# Altium footprint library Arduino Nano Every PCBLib.PcbLib: 81 footprints (part 2 of 6)
Each footprint in its own frame and in the unit in brackets; x right, y up, seen from the top. Pads: shape width x height; smd on the part's side, far side on the other; paste and mask are expansions set on the pad; w line width, h text height; cw(c..) or ccw(c..) is an arc to the next point about the centre after c.
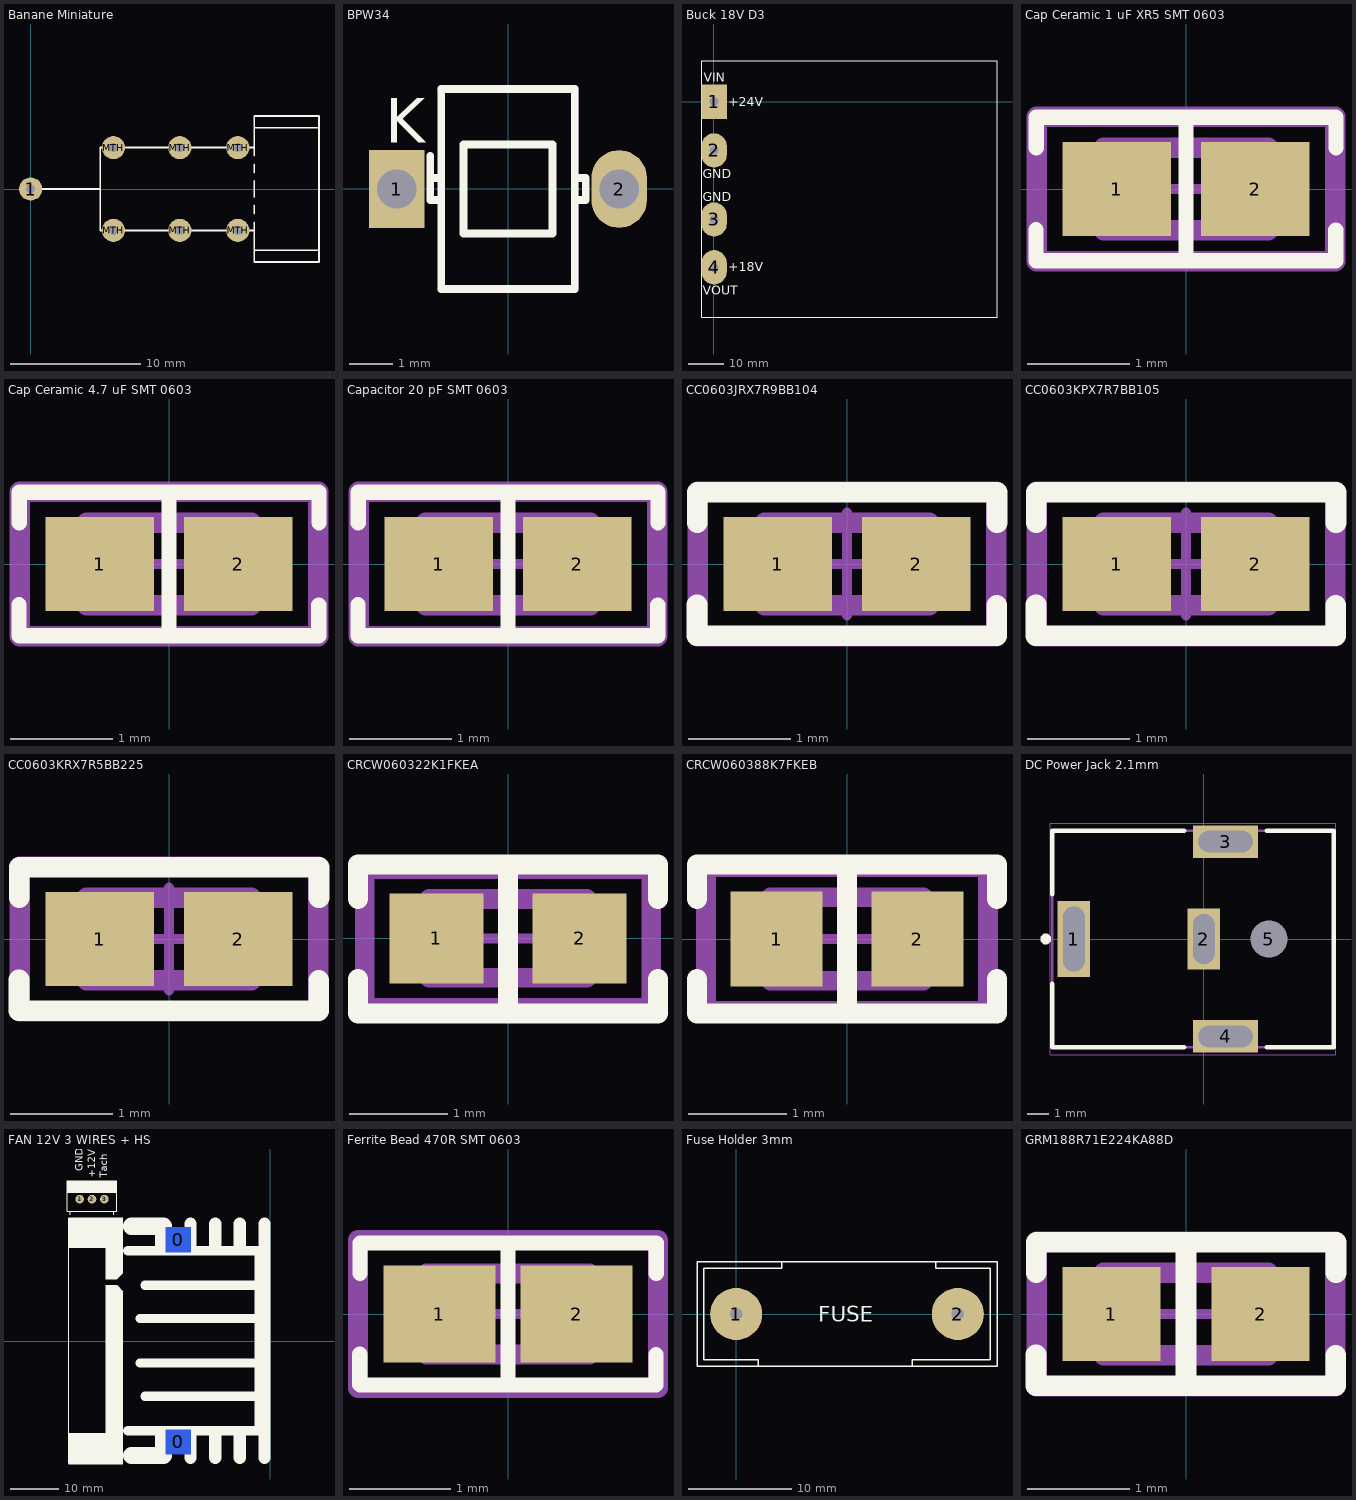
[diagram p1: the footprints below, top view; thin cyan lines are the x and y axes]

## Banane Miniature [mil] "Banane Miniature"
pads (7):
  round 70 hole 27.6: 1(0.02,1.07) MTH(250.02,-123.93) MTH(250.02,126.07) MTH(450.02,-123.93) MTH(450.02,126.07) MTH(625.02,-123.93) MTH(625.02,126.07)
Top Overlay:
  lines w5: 0.02,1.07 210.02,1.07 ; 675.02,-183.93 870.02,-183.93 ; 675.02,-98.93 675.02,-123.93 ; 675.02,-73.93 675.02,-48.93 ; 675.02,-23.93 675.02,26.07 ; 675.02,51.07 675.02,76.07 ; 675.02,101.07 675.02,126.07 ; 675.02,186.07 870.02,186.07 ; 675.02,-123.93 675.02,-218.93 870.02,-218.93 870.02,221.07 675.02,221.07 675.02,126.07 ; 675.02,-123.93 210.02,-123.93 210.02,126.07 675.02,126.07
3D body "User Library-Bananajack red.STEP": height 349.09, standoff -89.09, extent -69.98,-218.03 868.21,220.16

## BPW34 [mil] "BPW34 Trough Hole"
pads (2):
  rect 50x70 hole 35.4: 1(-100,-0.21)
  oval 50x70 hole 35.4: 2(100,-0.21)
Top Overlay:
  lines w7: -70,9.79 -60,9.79 ; -70,29.79 -70,-10.21 -60,-10.21 ; 60,-10.21 70,-10.21 70,9.79 60,9.79 ; -60,-90.21 60,-90.21 60,89.79 -60,89.79 -60,-90.21 ; -40,-40.21 40,-40.21 40,39.79 -40,39.79 -40,-0.21 -40,-40.21
  text "K" at -110.36,41.38 h40
Top Assembly:
  lines w7: -60,-90.21 60,-90.21 60,89.79 -60,89.79
3D body: height 77, standoff 75, extent -40,-40.21 40,39.79
3D body: height 70, standoff 10, extent -60,-90.21 60,89.79

## Buck 18V D3 [mil] "Buck 18V D3"
pads (4):
  rect 280x380 hole 100: 1(1.66,0.26)
  oval 280x380 hole 100: 2(1.66,-539.74) 3(1.66,-1304.74) 4(1.66,-1834.74)
Top Overlay:
  lines w5: -138.34,-2389.74 3136.66,-2389.74 3136.66,455.26 -138.34,455.26 -138.34,-2389.74
  text "VIN" at -113.34,220.26 h100
  text "+24V" at 156.66,-49.74 h100
  text "+18V" at 156.66,-1879.74 h100
  text "VOUT" at -123.34,-2139.74 h100
  text "GND" at -123.34,-1104.74 h100
  text "GND" at -123.34,-849.74 h100
3D body: height 410, standoff 360, extent 1186.65,-414.74 1361.66,-364.74
3D body: height 360, standoff 190, extent 1186.66,-414.74 1236.66,-364.74
3D body: height 62, standoff 0, extent -98.34,-1934.74 101.66,-1734.74
3D body: height 220, standoff -180, extent -40.34,-1876.73 43.66,-1792.73
3D body: height 62, standoff 0, extent -98.34,-1934.74 101.66,-1734.74
3D body: height 125, standoff 63, extent -98.34,-1934.74 101.66,-1734.74
3D body: height 260, standoff 190, extent -88.24,-1924.71 91.66,-1744.76
3D body: height 265, standoff 258, extent -43.34,-1879.74 46.66,-1789.74
3D body: height 62, standoff 0, extent -98.34,-1404.74 101.66,-1204.74
3D body: height 220, standoff -180, extent -40.34,-1346.74 43.66,-1262.74
3D body: height 62, standoff 0, extent -98.34,-1404.74 101.66,-1204.74
3D body: height 125, standoff 63, extent -98.34,-1404.74 101.66,-1204.74
3D body: height 260, standoff 190, extent -88.24,-1394.71 91.66,-1214.76
3D body: height 265, standoff 258, extent -43.34,-1349.74 46.66,-1259.74
3D body: height 62, standoff 0, extent -99.16,-640.39 100.84,-440.39
3D body: height 220, standoff -180, extent -41.15,-582.38 42.85,-498.38
3D body: height 62, standoff 0, extent -99.16,-640.39 100.84,-440.39
3D body: height 125, standoff 63, extent -99.16,-640.39 100.84,-440.39
3D body: height 260, standoff 190, extent -89.05,-630.36 90.85,-450.41
3D body: height 265, standoff 258, extent -44.15,-585.39 45.85,-495.39
3D body: height 269, standoff 190, extent 351.66,-329.73 451.66,-319.73
3D body: height 269, standoff 190, extent 351.66,-319.73 451.66,-219.73
3D body: height 269, standoff 190, extent 456.66,-329.73 556.66,-319.73
3D body: height 269, standoff 190, extent 456.66,-319.73 556.66,-219.73
3D body: height 269, standoff 190, extent 561.66,-329.73 661.66,-319.73
3D body: height 269, standoff 190, extent 561.66,-319.73 661.66,-219.73
3D body: height 269, standoff 190, extent 666.66,-329.73 766.66,-319.73
3D body: height 269, standoff 190, extent 666.66,-319.73 766.66,-219.73
3D body: height 269, standoff 190, extent 771.66,-329.73 871.66,-319.73
3D body: height 269, standoff 190, extent 771.66,-319.73 871.66,-219.73
3D body: height 269, standoff 190, extent 876.66,-329.73 976.66,-319.73
3D body: height 269, standoff 190, extent 876.66,-319.73 976.66,-219.73
3D body: height 269, standoff 190, extent 981.66,-329.73 1081.66,-319.73
3D body: height 269, standoff 190, extent 981.66,-319.73 1081.66,-219.73
3D body: height 360, standoff 190, extent 911.66,-699.74 961.66,-649.74
3D body: height 360, standoff 190, extent 911.66,-574.74 961.66,-524.74
3D body: height 360, standoff 190, extent 911.66,-449.74 961.66,-399.74
3D body: height 360, standoff 190, extent 911.66,-139.74 961.66,-89.74
3D body: height 360, standoff 190, extent 911.66,-14.74 961.66,35.26
3D body: height 410, standoff 360, extent 211.66,-574.74 961.66,-524.74
3D body: height 191, standoff 190, extent -128.34,-854.74 -53.34,-744.74
3D body: height 191, standoff 190, extent 71.66,-854.74 146.66,-744.74
3D body: height 191, standoff 190, extent -28.34,-854.74 46.66,-744.74
3D body: height 191, standoff 190, extent 171.66,-2144.74 246.66,-2034.74
3D body: height 191, standoff 190, extent 71.66,-2144.74 146.66,-2034.74
3D body: height 191, standoff 190, extent -28.34,-2144.74 46.66,-2034.74
3D body: height 191, standoff 190, extent -128.34,-2144.74 -48.34,-2034.74
3D body: height 191, standoff 190, extent 66.66,215.26 141.66,325.26
3D body: height 191, standoff 190, extent -18.34,215.26 26.66,325.26
3D body: height 191, standoff 190, extent -118.34,215.26 -38.34,325.26
3D body: height 186, standoff 185, extent 2346.66,-729.74 3061.66,-329.74
3D body: height 186, standoff 185, extent 2346.66,-2164.74 3061.66,-809.74
3D body: height 186, standoff 185, extent -138.34,-2069.74 1541.66,-1599.74
3D body: height 186, standoff 185, extent -138.34,-1539.74 1541.66,-1069.74
3D body: height 186, standoff 185, extent -138.34,-774.74 1541.66,-304.74
3D body: height 186, standoff 185, extent -138.34,-234.74 1541.66,235.26
3D body: height 269, standoff 190, extent 1086.66,-319.74 1186.66,-219.74
3D body: height 269, standoff 190, extent 1086.66,-329.74 1186.66,-319.74
3D body: height 265, standoff 258, extent -43.34,-44.74 46.66,45.26
3D body: height 260, standoff 190, extent -88.23,-89.71 91.67,90.24
3D body: height 185, standoff 130, extent -138.34,-2389.74 3136.66,455.26
3D body: height 505, standoff 190, extent 2471.66,-1009.74 2941.66,-539.74
3D body: height 509, standoff 504, extent 2518.87,-962.68 2894.66,-586.79
3D body: height 311, standoff 309, extent 1366.66,-1664.74 1541.66,-1634.74
3D body: height 310, standoff 190, extent 1366.66,-1719.74 1541.66,-1429.74
3D body: height 311, standoff 309, extent 1186.66,-1664.74 1361.66,-1634.74
3D body: height 310, standoff 190, extent 1186.66,-1719.74 1361.66,-1429.74
3D body: height 215, standoff 190, extent 1711.66,-1039.74 1911.66,-839.74
3D body: height 290, standoff 190, extent 1656.66,-279.74 1956.66,20.26
3D body: height 290, standoff 190, extent 1846.66,-654.74 2146.66,-354.74
3D body: height 475, standoff 295, extent 1361.66,-464.74 1761.66,-64.74
3D body: height 350, standoff 295, extent 1761.66,-464.74 2061.66,-64.74
3D body: height 525, standoff 520, extent 561.66,-189.74 686.66,225.26
3D body: height 525, standoff 520, extent 561.66,-764.74 686.66,-344.74
3D body: height 315, standoff 175, extent 261.66,-139.74 436.66,160.26
3D body: height 410, standoff 360, extent 211.66,-14.74 961.66,35.26
3D body: height 410, standoff 360, extent 211.66,110.26 961.66,160.26
3D body: height 410, standoff 360, extent 211.66,-139.74 961.66,-89.74
3D body: height 360, standoff 190, extent 911.66,110.26 961.66,160.26
3D body: height 245, standoff 190, extent 436.66,-139.74 561.66,160.26
3D body: height 245, standoff 190, extent 436.66,-699.74 561.66,-399.74
3D body: height 315, standoff 190, extent 261.66,-699.74 436.66,-399.74
3D body: height 410, standoff 360, extent 211.66,-699.74 961.66,-649.74
3D body: height 410, standoff 360, extent 211.66,-449.74 961.66,-399.74
3D body: height 360, standoff 190, extent 1186.66,-164.74 1236.66,-114.74
3D body: height 410, standoff 360, extent 1186.65,-164.74 1361.66,-114.74
3D body: height 130, standoff 30, extent 2761.66,85.26 3111.66,435.26
3D body: height 130, standoff 30, extent 2761.66,-2364.74 3111.66,-2014.74
3D body: height 125, standoff 63, extent -98.34,-99.74 101.66,100.26
3D body: height 62, standoff 0, extent -98.34,-99.74 101.66,100.26
3D body: height 222, standoff -178, extent -40.34,-41.73 43.66,42.27
3D body: height 62, standoff 0, extent -98.34,-99.74 101.66,100.26
3D body: height 135, standoff 65, extent -48.24,-639.71 131.66,-459.76
3D body: height 140, standoff 133, extent -3.34,-594.74 86.66,-504.74
3D body: height 220, standoff -180, extent -40.34,-1346.74 43.66,-1262.74
3D body: height 62, standoff 0, extent -98.34,-1404.74 101.66,-1204.74
3D body: height 135, standoff 65, extent -88.24,-1394.71 91.66,-1214.76
3D body: height 140, standoff 133, extent -43.34,-1349.74 46.66,-1259.74
3D body: height 135, standoff 65, extent -48.24,-1934.71 131.66,-1754.76
3D body: height 140, standoff 133, extent -3.34,-1889.74 86.66,-1799.74
3D body: height 200, standoff 190, extent 1626.65,-229.74 1656.66,-29.74
3D body: height 200, standoff 190, extent 2146.65,-604.74 2176.66,-404.74
3D body: height 200, standoff 190, extent 1956.66,-39.74 1996.66,-9.74
3D body: height 200, standoff 190, extent 1956.66,-249.74 1996.66,-219.74
3D body: height 200, standoff 190, extent 1806.66,-624.74 1846.66,-594.74
3D body: height 200, standoff 190, extent 1806.66,-414.74 1846.66,-384.74
3D body: height 352, standoff 350, extent 1866.75,-344.71 2016.66,-194.76
3D body "RESISTOR 0.25W 0.4.STEP": height 405.5, standoff 190, extent 1261.15,-1778.74 1352.16,-1354.74
3D body "Led 3mm vert.STEP": height 340.51, standoff 214, extent 1007.59,-1429.59 1301.66,-1299.74
3D body: height 191, standoff 190, extent 1560.41,-812.24 1642.91,-737.24
3D body: height 191, standoff 190, extent 1560.41,-937.24 1642.91,-862.24
3D body: height 191, standoff 190, extent 2010.41,-1237.24 2092.91,-1162.24
3D body: height 191, standoff 190, extent 2110.41,-1237.24 2192.91,-1162.24
3D body: height 191, standoff 190, extent 2235.41,-1187.24 2317.91,-1112.24
3D body: height 191, standoff 190, extent 2235.41,-1287.24 2317.91,-1212.24
3D body: height 191, standoff 190, extent 2235.41,-1062.24 2317.91,-987.24
3D body: height 191, standoff 190, extent 2235.41,-1412.24 2317.91,-1337.24
3D body: height 191, standoff 190, extent 1955.41,-62.24 2037.91,12.76
3D body: height 191, standoff 190, extent 1955.41,-272.24 2037.91,-197.24
3D body: height 191, standoff 190, extent 1765.42,-437.24 1847.91,-362.24
3D body: height 191, standoff 190, extent 1765.42,-647.24 1847.91,-572.24
3D body: height 200, standoff 190, extent 1716.66,-1064.74 1726.66,-1034.73
3D body: height 200, standoff 190, extent 1736.66,-1064.74 1746.66,-1034.73
3D body: height 200, standoff 190, extent 1756.66,-1064.74 1766.66,-1034.73
3D body: height 200, standoff 190, extent 1776.66,-1064.74 1786.66,-1034.73
3D body: height 200, standoff 190, extent 1796.66,-1064.74 1806.66,-1034.73
3D body: height 200, standoff 190, extent 1816.66,-1064.74 1826.66,-1034.73
3D body: height 200, standoff 190, extent 1836.66,-1064.74 1846.66,-1034.73
3D body: height 200, standoff 190, extent 1856.66,-1064.74 1866.66,-1034.73
3D body: height 200, standoff 190, extent 1876.66,-1064.74 1886.66,-1034.73
3D body: height 200, standoff 190, extent 1896.66,-1064.74 1906.66,-1034.73
3D body: height 200, standoff 190, extent 1896.66,-844.74 1906.66,-814.73
3D body: height 200, standoff 190, extent 1876.66,-844.74 1886.66,-814.73
3D body: height 200, standoff 190, extent 1856.66,-844.74 1866.66,-814.73
3D body: height 200, standoff 190, extent 1836.66,-844.74 1846.66,-814.73
3D body: height 200, standoff 190, extent 1816.66,-844.74 1826.66,-814.73
3D body: height 200, standoff 190, extent 1796.66,-844.74 1806.66,-814.73
3D body: height 200, standoff 190, extent 1776.66,-844.74 1786.66,-814.73
3D body: height 200, standoff 190, extent 1756.66,-844.74 1766.66,-814.73
3D body: height 200, standoff 190, extent 1736.66,-844.74 1746.66,-814.73
3D body: height 200, standoff 190, extent 1716.66,-844.74 1726.66,-814.73
3D body: height 225, standoff 190, extent 1761.66,-769.73 1811.66,-719.74
3D body: height 225, standoff 190, extent 1811.66,-769.73 1821.66,-719.74
3D body: height 225, standoff 190, extent 1751.66,-769.73 1761.66,-719.74
3D body: height 225, standoff 190, extent 1926.65,-804.74 1976.65,-754.73
3D body: height 225, standoff 190, extent 1926.65,-754.73 1976.65,-744.73
3D body: height 225, standoff 190, extent 1926.65,-814.74 1976.65,-804.74
3D body: height 225, standoff 190, extent 1701.65,-1184.74 1751.65,-1134.73
3D body: height 225, standoff 190, extent 1701.65,-1134.73 1751.65,-1124.73
3D body: height 225, standoff 190, extent 1701.65,-1194.74 1751.65,-1184.74
3D body: height 225, standoff 190, extent 1931.65,-1159.74 1981.65,-1109.75
3D body: height 225, standoff 190, extent 1921.65,-1159.74 1931.65,-1109.75
3D body: height 225, standoff 190, extent 1981.65,-1159.74 1991.65,-1109.75
3D body: height 225, standoff 190, extent 1931.65,-1294.74 1981.65,-1244.75
3D body: height 225, standoff 190, extent 1921.65,-1294.74 1931.65,-1244.75
3D body: height 225, standoff 190, extent 1981.65,-1294.74 1991.65,-1244.75
3D body: height 225, standoff 190, extent 1931.65,-1359.74 1981.65,-1309.75
3D body: height 225, standoff 190, extent 1921.65,-1359.74 1931.65,-1309.75
3D body: height 225, standoff 190, extent 1981.65,-1359.74 1991.65,-1309.75
3D body: height 225, standoff 190, extent 1576.65,-1019.74 1626.65,-969.75
3D body: height 225, standoff 190, extent 1566.65,-1019.74 1576.65,-969.75
3D body: height 225, standoff 190, extent 1626.65,-1019.74 1636.65,-969.75
3D body: height 225, standoff 190, extent 1576.65,-1109.74 1626.65,-1059.75
3D body: height 225, standoff 190, extent 1566.65,-1109.74 1576.65,-1059.75
3D body: height 225, standoff 190, extent 1626.65,-1109.74 1636.65,-1059.75
3D body: height 200, standoff 190, extent 2611.65,-539.74 2811.65,-509.74
3D body: height 200, standoff 190, extent 2601.65,-1039.74 2801.65,-1009.74
3D body: height 200, standoff 190, extent 1366.65,-1749.74 1541.66,-1719.74
3D body: height 200, standoff 190, extent 1186.65,-1749.74 1361.66,-1719.74
3D body: height 200, standoff 190, extent 1366.65,-1429.74 1541.66,-1399.74
3D body: height 200, standoff 190, extent 1186.65,-1429.74 1361.66,-1399.74
3D body: height 192, standoff 190, extent 1256.72,-1828.72 1356.66,-1728.75
3D body: height 192, standoff 190, extent 1256.71,-1404.72 1356.66,-1304.75
3D body: height 192, standoff 190, extent 836.77,-524.71 1036.66,-324.76
3D body: height 192, standoff 190, extent 836.77,-649.71 1036.66,-449.76
3D body: height 192, standoff 190, extent 836.77,-774.71 1036.66,-574.77
3D body: height 192, standoff 190, extent 1111.77,-489.71 1311.66,-289.76
3D body: height 192, standoff 190, extent 1111.77,-239.7 1311.66,-39.76
3D body: height 192, standoff 190, extent 836.77,-214.71 1036.66,-14.77
3D body: height 192, standoff 190, extent 836.77,-89.71 1036.66,110.24
3D body: height 192, standoff 190, extent 836.77,35.29 1036.66,235.24
3D body: height 520, standoff 190, extent 561.66,-189.74 686.66,225.26
3D body: height 520, standoff 190, extent 561.66,-759.74 686.66,-344.74
3D body: height 269, standoff 190, extent 1086.66,-219.74 1186.66,-209.74
3D body: height 269, standoff 190, extent 981.66,-219.73 1081.66,-209.73
3D body: height 269, standoff 190, extent 876.66,-219.73 976.66,-209.73
3D body: height 269, standoff 190, extent 771.66,-219.73 871.66,-209.73
3D body: height 269, standoff 190, extent 666.66,-219.73 766.66,-209.73
3D body: height 269, standoff 190, extent 561.66,-219.73 661.66,-209.73
3D body: height 269, standoff 190, extent 456.66,-219.73 556.66,-209.73
3D body: height 269, standoff 190, extent 351.66,-219.73 451.66,-209.73
3D body: height 192, standoff 190, extent 346.66,-214.73 1191.66,-194.74
3D body: height 192, standoff 190, extent 346.66,-344.73 1191.66,-324.74
3D body: height 191, standoff 190, extent -28.34,-1109.74 46.66,-999.74
3D body: height 191, standoff 190, extent 71.66,-1109.74 146.66,-999.74
3D body: height 191, standoff 190, extent -128.34,-1109.74 -53.34,-999.74

## Cap Ceramic 1 uF XR5 SMT 0603 [mm] "1 µF ±10% 16V Ceramic Capacitor X5R 0603 (1608 Metric)"
pads (2):
  rect 1.058x0.912 smd paste+0 mask+0: 1(-0.677,0) 2(0.677,0)
Top Overlay:
  lines w0.15: -1.462,-0.696 -1.462,-0.396 ; -1.459,-0.699 1.459,-0.699 1.459,-0.399 ; -1.459,0.401 -1.459,0.701 1.462,0.701 1.462,0.401 ; 0,-0.699 0,0.699
Top Assembly:
  lines w0.2: -1.456,-0.706 -1.456,0.706 1.456,0.706 1.456,-0.706 -1.456,-0.706
Top Courtyard:
  lines w0.2: -1.456,-0.706 -1.456,0.706 1.456,0.706 1.456,-0.706 -1.456,-0.706
Board:
  lines w0.2: -0.8,-0.4 -0.8,0.4 0.8,0.4 0.8,-0.4 -0.8,-0.4
Top Component Center:
  lines w0.1: -0.5,0 0.5,0 ; 0,-0.5 0,0.5
3D body "Cap_YAGEO_CC0603KRX7R9BB271_eec.STEP": height 0.25, standoff 0, extent -1.456,-0.706 1.456,0.706

## Cap Ceramic 4.7 uF SMT 0603 [mm] "4.7 µF ±10% 16V Ceramic Capacitor X5R 0603 (1608 Metric)"
pads (2):
  rect 1.058x0.912 smd paste+0 mask+0: 1(-0.677,0) 2(0.677,0)
Top Overlay:
  lines w0.15: -1.462,-0.696 -1.462,-0.396 ; -1.459,-0.699 1.459,-0.699 1.459,-0.399 ; -1.459,0.401 -1.459,0.701 1.462,0.701 1.462,0.401 ; 0,-0.699 0,0.699
Top Assembly:
  lines w0.2: -1.456,-0.706 -1.456,0.706 1.456,0.706 1.456,-0.706 -1.456,-0.706
Top Courtyard:
  lines w0.2: -1.456,-0.706 -1.456,0.706 1.456,0.706 1.456,-0.706 -1.456,-0.706
Board:
  lines w0.2: -0.8,-0.4 -0.8,0.4 0.8,0.4 0.8,-0.4 -0.8,-0.4
Top Component Center:
  lines w0.1: -0.5,0 0.5,0 ; 0,-0.5 0,0.5
3D body "Cap_YAGEO_CC0603KRX7R9BB271_eec.STEP": height 0.25, standoff 0, extent -1.456,-0.706 1.456,0.706

## Capacitor 20 pF SMT 0603 [mm]
pads (2):
  rect 1.058x0.912 smd paste+0 mask+0: 1(-0.677,0) 2(0.677,0)
Top Overlay:
  lines w0.15: -1.462,-0.697 -1.462,-0.397 ; -1.459,-0.7 1.459,-0.7 1.459,-0.4 ; -1.459,0.4 -1.459,0.7 1.462,0.7 1.462,0.4 ; 0,-0.7 0,0.699
Top Assembly:
  lines w0.2: -1.456,-0.706 1.456,-0.706 1.456,0.706 -1.456,0.706 -1.456,-0.706
Top Courtyard:
  lines w0.2: -1.456,-0.706 1.456,-0.706 1.456,0.706 -1.456,0.706 -1.456,-0.706
Board:
  lines w0.2: -0.8,-0.4 0.8,-0.4 0.8,0.4 -0.8,0.4 -0.8,-0.4
Top Component Center:
  lines w0.1: -0.5,0 0.5,0 -0.5,0 ; 0,-0.5 0,0.5 0,-0.5
3D body "Cap_Yageo_CC0603JRNPO9BN200_eec.STEP": height 0.25, standoff 0, extent -1.456,-0.706 1.456,0.706

## CC0603JRX7R9BB104 [mm] "0.1 µF ±5% 50V Ceramic Capacitor X7R 0603 (1608 Metric)"
pads (2):
  rect 1.058x0.912 smd paste+0 mask+0: 1(-0.677,0) 2(0.677,0)
Top Overlay:
  lines w0.2: -1.462,-0.697 -1.462,-0.397 ; -1.459,-0.7 1.459,-0.7 1.459,-0.4 ; -1.459,0.4 -1.459,0.7 1.462,0.7 1.462,0.4
Top Assembly:
  lines w0.2: -1.456,-0.706 1.456,-0.706 1.456,0.706 -1.456,0.706 -1.456,-0.706
Top Courtyard:
  lines w0.2: -1.456,-0.706 1.456,-0.706 1.456,0.706 -1.456,0.706 -1.456,-0.706
Board:
  lines w0.2: -0.8,-0.4 0.8,-0.4 0.8,0.4 -0.8,0.4 -0.8,-0.4
Top Component Center:
  lines w0.1: -0.5,0 0.5,0 ; 0,-0.5 0,0.5
3D body "Cap_YAGEO_CC0603KRX7R9BB271_eec.STEP": height 0.25, standoff 0, extent -1.456,-0.706 1.456,0.706

## CC0603KPX7R7BB105 [mm] "1 µF ±10% 16V Ceramic Capacitor X7R 0603 (1608 Metric)"
pads (2):
  rect 1.058x0.912 smd paste+0 mask+0: 1(-0.677,0) 2(0.677,0)
Top Overlay:
  lines w0.2: -1.462,-0.697 -1.462,-0.397 ; -1.459,-0.7 1.459,-0.7 1.459,-0.4 ; -1.459,0.4 -1.459,0.7 1.462,0.7 1.462,0.4
Top Assembly:
  lines w0.2: -1.456,-0.706 1.456,-0.706 1.456,0.706 -1.456,0.706 -1.456,-0.706
Top Courtyard:
  lines w0.2: -1.456,-0.706 1.456,-0.706 1.456,0.706 -1.456,0.706 -1.456,-0.706
Board:
  lines w0.2: -0.8,-0.4 0.8,-0.4 0.8,0.4 -0.8,0.4 -0.8,-0.4
Top Component Center:
  lines w0.1: -0.5,0 0.5,0 ; 0,-0.5 0,0.5
3D body "Cap_YAGEO_CC0603KRX7R9BB271_eec.STEP": height 0.25, standoff 0, extent -1.456,-0.706 1.456,0.706

## CC0603KRX7R5BB225 [mm] "2.2 µF ±10% 6.3V Ceramic Capacitor X7R 0603 (1608 Metric)"
pads (2):
  rect 1.058x0.912 smd paste+0 mask+0: 1(-0.677,0) 2(0.677,0)
Top Overlay:
  lines w0.2: -1.462,-0.697 -1.462,-0.397 ; -1.459,-0.7 1.459,-0.7 1.459,-0.4 ; -1.459,0.4 -1.459,0.7 1.462,0.7 1.462,0.4
Mechanical 5:
  lines w0.2: -1.456,-0.706 -1.456,0.706 1.456,0.706 1.456,-0.706 -1.456,-0.706
Mechanical 13:
  lines w0.2: -0.8,-0.4 -0.8,0.4 0.8,0.4 0.8,-0.4 -0.8,-0.4
Mechanical 15:
  lines w0.2: -1.456,-0.706 -1.456,0.706 1.456,0.706 1.456,-0.706 -1.456,-0.706
Top Component Center:
  lines w0.1: -0.5,0 0.5,0 ; 0,-0.5 0,0.5
3D body "Cap_YAGEO_CC0603KRX7R9BB271_eec.STEP": height 0.25, standoff 0, extent -1.456,-0.706 1.456,0.706

## CRCW060322K1FKEA [mm] "Res Thick Film 0603 22.1K Ohm 1% 1/10W ±100ppm/°C Molded SMD SMD Paper T/R"
pads (2):
  rect 0.958x0.912 smd paste+0 mask+0: 1(-0.727,0) 2(0.727,0)
Top Overlay:
  lines w0.2: -1.524,-0.412 -1.524,-0.762 1.524,-0.762 1.524,-0.412 ; -1.524,0.4 -1.524,0.75 1.524,0.75 1.524,0.4 ; 0,-0.762 0,0.75
Mechanical 5:
  lines w0.2: -1.456,-0.706 -1.456,0.706 1.456,0.706 1.456,-0.706 -1.456,-0.706
Mechanical 13:
  lines w0.2: -0.8,-0.4 -0.8,0.4 0.8,0.4 0.8,-0.4 -0.8,-0.4
Mechanical 15:
  lines w0.2: -1.456,-0.706 -1.456,0.706 1.456,0.706 1.456,-0.706 -1.456,-0.706
Top Component Center:
  lines w0.1: -0.5,0 0.5,0 ; 0,-0.5 0,0.5
3D body "Res_Vishay_CRCW06030000Z0EBC_eec.STEP": height 0.25, standoff 0, extent -1.456,-0.706 1.456,0.706

## CRCW060388K7FKEB [mm] "88.7 kOhms ±1% 0.1W, 1/10W Chip Resistor 0603 (1608 Metric) Automotive AEC-Q200 Thick Film"
pads (2):
  rect 0.935x0.962 smd paste+0 mask+0: 1(-0.715,0) 2(0.715,0)
Top Overlay:
  lines w0.2: -1.524,-0.406 -1.524,-0.756 1.524,-0.756 1.524,-0.406 ; -1.524,0.406 -1.524,0.756 1.524,0.756 1.524,0.406 ; 0,-0.756 0,0.756
Top Assembly:
  lines w0.2: -1.433,-0.731 1.433,-0.731 1.433,0.731 -1.433,0.731 -1.433,-0.731
Top Courtyard:
  lines w0.2: -1.433,-0.731 1.433,-0.731 1.433,0.731 -1.433,0.731 -1.433,-0.731
Board:
  lines w0.2: -0.775,-0.425 0.775,-0.425 0.775,0.425 -0.775,0.425 -0.775,-0.425
Top Component Center:
  lines w0.1: -0.5,0 0.5,0 ; 0,-0.5 0,0.5
3D body "Res_Vishay_CRCW06033M90FKEC_eec.STEP": height 0.25, standoff 0, extent -1.433,-0.731 1.433,0.731

## DC Power Jack 2.1mm [mm] "PJ-063AH"
pads (5):
  rect 1.5x3.5 hole 1 slot 3 at 90 deg: 1(-6,0)
  rect 1.5x2.8 hole 1 slot 2.3 at 90 deg: 2(0,0)
  rect 3x1.5 hole 1 slot 2.5 at 0 deg: 3(1,4.5) 4(1,-4.5)
  round 1.4 hole 1.7 unplated: 5(3,0)
Top Overlay:
  circle w0.25: c-7.3,0 r0.125
  lines w0.2: -7,-2.062 -7,-5 -0.9,-5 ; -7,2.062 -7,5 -0.9,5 ; 2.9,-5 6,-5 6,5 2.9,5
Mechanical 13:
  lines w0.1: -7,-5 6,-5 6,5 -7,5 -7,-5
Mechanical 15:
  lines w0.05: -7.1,-5.35 6.1,-5.35 6.1,5.35 -7.1,5.35 -7.1,-5.35
  lines w0.1: -0.5,0 0.5,0 ; 0,-0.5 0,0.5
3D body "pj-063ah.stp": height 9, standoff -3, extent -7,-5.15 6,5.15

## FAN 12V 3 WIRES + HS [mil]
pads (5):
  rect 200x200 smd far side: 0(-745.94,-818.28) 0(-745.94,821.72)
  round 70 hole 35.4: 1(-1545.94,1151.72) 2(-1445.94,1151.72) 3(-1345.94,1151.72)
Top Overlay:
  rectangle: -125.94,-748.28 4.06,751.72
  rectangle: -1645.94,1201.72 -1245.94,1301.72
  region: -1245.94,451.72 -1195.94,401.72 -1195.94,-998.28 -1635.94,-998.28 -1635.94,-748.28 -1335.94,-748.28 -1335.94,451.72
  region: -1195.94,1001.72 -1195.94,551.72 -1245.94,501.72 -1335.94,501.72 -1335.94,756.72 -1630.94,756.72 -1630.94,996.72 -1635.94,1001.72
  lines w10: -1635.94,-993.28 -1635.94,996.72 ; -1620.94,1026.72 -1620.94,1051.72 ; -1335.94,451.72 -1245.94,451.72 -1195.94,401.72 ; -1270.94,1026.72 -1270.94,1051.72 ; -1645.94,1051.72 -1245.94,1051.72 -1245.94,1301.72 -1645.94,1301.72 -1645.94,1051.72
  lines w75: -1155.94,-728.28 -95.94,-728.28 ; -1155.94,731.72 -95.94,731.72 ; -1055.94,-178.28 -95.94,-178.28 ; -1055.94,181.72 -95.94,181.72 ; -1015.94,-448.28 -95.94,-448.28 ; -1015.94,451.72 -95.94,451.72
  lines w100: -645.94,-948.28 -645.94,-748.28 ; -645.94,751.72 -645.94,951.72 ; -445.94,-948.28 -445.94,-748.28 ; -445.94,751.72 -445.94,951.72 ; -245.94,-948.28 -245.94,-748.28 ; -245.94,751.72 -245.94,951.72 ; -45.94,-948.28 -45.94,951.72
  lines w140: -1125.94,-928.28 -865.94,-928.28 -865.94,-768.28 ; -1125.94,931.72 -865.94,931.72 -865.94,771.72
  text "Tach" at -1320.94,1326.72 h60
  text "+12V" at -1420.94,1326.72 h60
  text "GND" at -1520.94,1376.72 h60

## Ferrite Bead 470R SMT 0603 [mm] "470 Ohms @ 100 MHz 1 Power Line Ferrite Bead 0603 (1608 Metric) 1A 200mOhm"
pads (2):
  rect 1.106x0.958 smd paste+0 mask+0: 1(-0.676,0) 2(0.676,0)
Top Overlay:
  lines w0.15: -1.462,-0.696 -1.462,-0.396 ; -1.459,-0.699 1.459,-0.699 1.459,-0.399 ; -1.459,0.401 -1.459,0.701 1.462,0.701 1.462,0.401 ; 0,-0.699 0,0.699
Top Assembly:
  lines w0.2: -1.479,-0.729 1.479,-0.729 1.479,0.729 -1.479,0.729 -1.479,-0.729
Top Courtyard:
  lines w0.2: -1.479,-0.729 1.479,-0.729 1.479,0.729 -1.479,0.729 -1.479,-0.729
Board:
  lines w0.2: -0.8,-0.4 0.8,-0.4 0.8,0.4 -0.8,0.4 -0.8,-0.4
Top Component Center:
  lines w0.1: -0.5,0 0.5,0 ; 0,-0.5 0,0.5
3D body "FBead_Murata_BLM18EG221SN1D_eec.STEP": height 0.25, standoff 0, extent -1.479,-0.729 1.479,0.729

## Fuse Holder 3mm [mm] "Fuse Holder 3mm"
pads (2):
  round 5.08 hole 1.199: 1(-0.029,0) 2(21.561,0)
Top Overlay:
  lines w0.127: 2.13,-5.08 2.13,-4.445 -3.204,-4.445 -3.204,4.445 4.416,4.445 4.416,5.08 ; 17.116,-5.08 17.116,-4.445 24.736,-4.445 24.736,4.445 19.402,4.445 19.402,5.08 ; -3.839,-5.08 25.371,-5.08 25.371,5.08 -3.839,5.08 -3.839,-5.08
  text "FUSE" at 7.972,-0.762 h1.52
3D body: height 2.92, standoff 0.13, extent -3.839,-5.08 25.371,5.08
3D body: height 10.16, standoff 2.92, extent -3.839,-5.08 4.416,5.08
3D body: height 10.16, standoff 2.92, extent 17.116,-5.08 25.371,5.08
3D body: height 0.13, standoff -4.95, extent -0.611,-0.583 0.555,0.584
3D body: height 0.13, standoff -4.95, extent 20.979,-0.583 22.145,0.584
3D body: height 9.53, standoff 2.92, extent 0.479,-4.318 1.241,-3.175
3D body: height 9.53, standoff 2.92, extent 0.479,3.175 1.241,4.318
3D body: height 2.95, standoff 2.92, extent -3.204,-4.318 1.241,4.318
3D body: height 2.95, standoff 2.92, extent 20.291,-4.318 24.736,4.318
3D body: height 9.53, standoff 2.92, extent 20.291,3.175 21.053,4.318
3D body: height 9.53, standoff 2.92, extent 20.291,-4.318 21.053,-3.175
3D body: height 4.44, standoff 2.92, extent 19.402,-3.175 20.037,3.175
3D body: height 4.44, standoff 2.92, extent 1.495,-3.175 2.13,3.175
3D body: height 3, standoff 2.92, extent 3.147,3.048 4.416,4.318
3D body: height 3, standoff 2.92, extent 3.147,-4.318 4.416,-3.048
3D body: height 3, standoff 2.92, extent 17.117,-4.318 18.386,-3.048
3D body: height 3, standoff 2.92, extent 17.117,3.048 18.386,4.318

## GRM188R71E224KA88D [mm] "0.22 µF ±10% 25V Ceramic Capacitor X7R 0603 (1608 Metric)"
pads (2):
  rect 0.959x0.912 smd paste+0 mask+0: 1(-0.727,0) 2(0.727,0)
Top Overlay:
  lines w0.2: -1.462,-0.697 -1.462,-0.397 ; -1.459,-0.7 1.459,-0.7 1.459,-0.4 ; -1.459,0.4 -1.459,0.7 1.462,0.7 1.462,0.4 ; 0,-0.7 0,0.7
Top Assembly:
  lines w0.2: -1.456,-0.706 1.456,-0.706 1.456,0.706 -1.456,0.706 -1.456,-0.706
Top Courtyard:
  lines w0.2: -1.456,-0.706 1.456,-0.706 1.456,0.706 -1.456,0.706 -1.456,-0.706
Board:
  lines w0.2: -0.8,-0.4 0.8,-0.4 0.8,0.4 -0.8,0.4 -0.8,-0.4
Top Component Center:
  lines w0.1: -0.5,0 0.5,0 ; 0,-0.5 0,0.5
3D body "Cap_Murata_GRM188R61E225KA12D_eec.STEP": height 0.25, standoff 0, extent -1.456,-0.706 1.456,0.706